# Altium footprint library Dart_Controller_Pcblib.PcbLib: 132 footprints (part 1 of 9)
Each footprint in its own frame and in the unit in brackets; x right, y up, seen from the top. Pads: shape width x height; smd on the part's side, far side on the other; paste and mask are expansions set on the pad; w line width, h text height; cw(c..) or ccw(c..) is an arc to the next point about the centre after c.
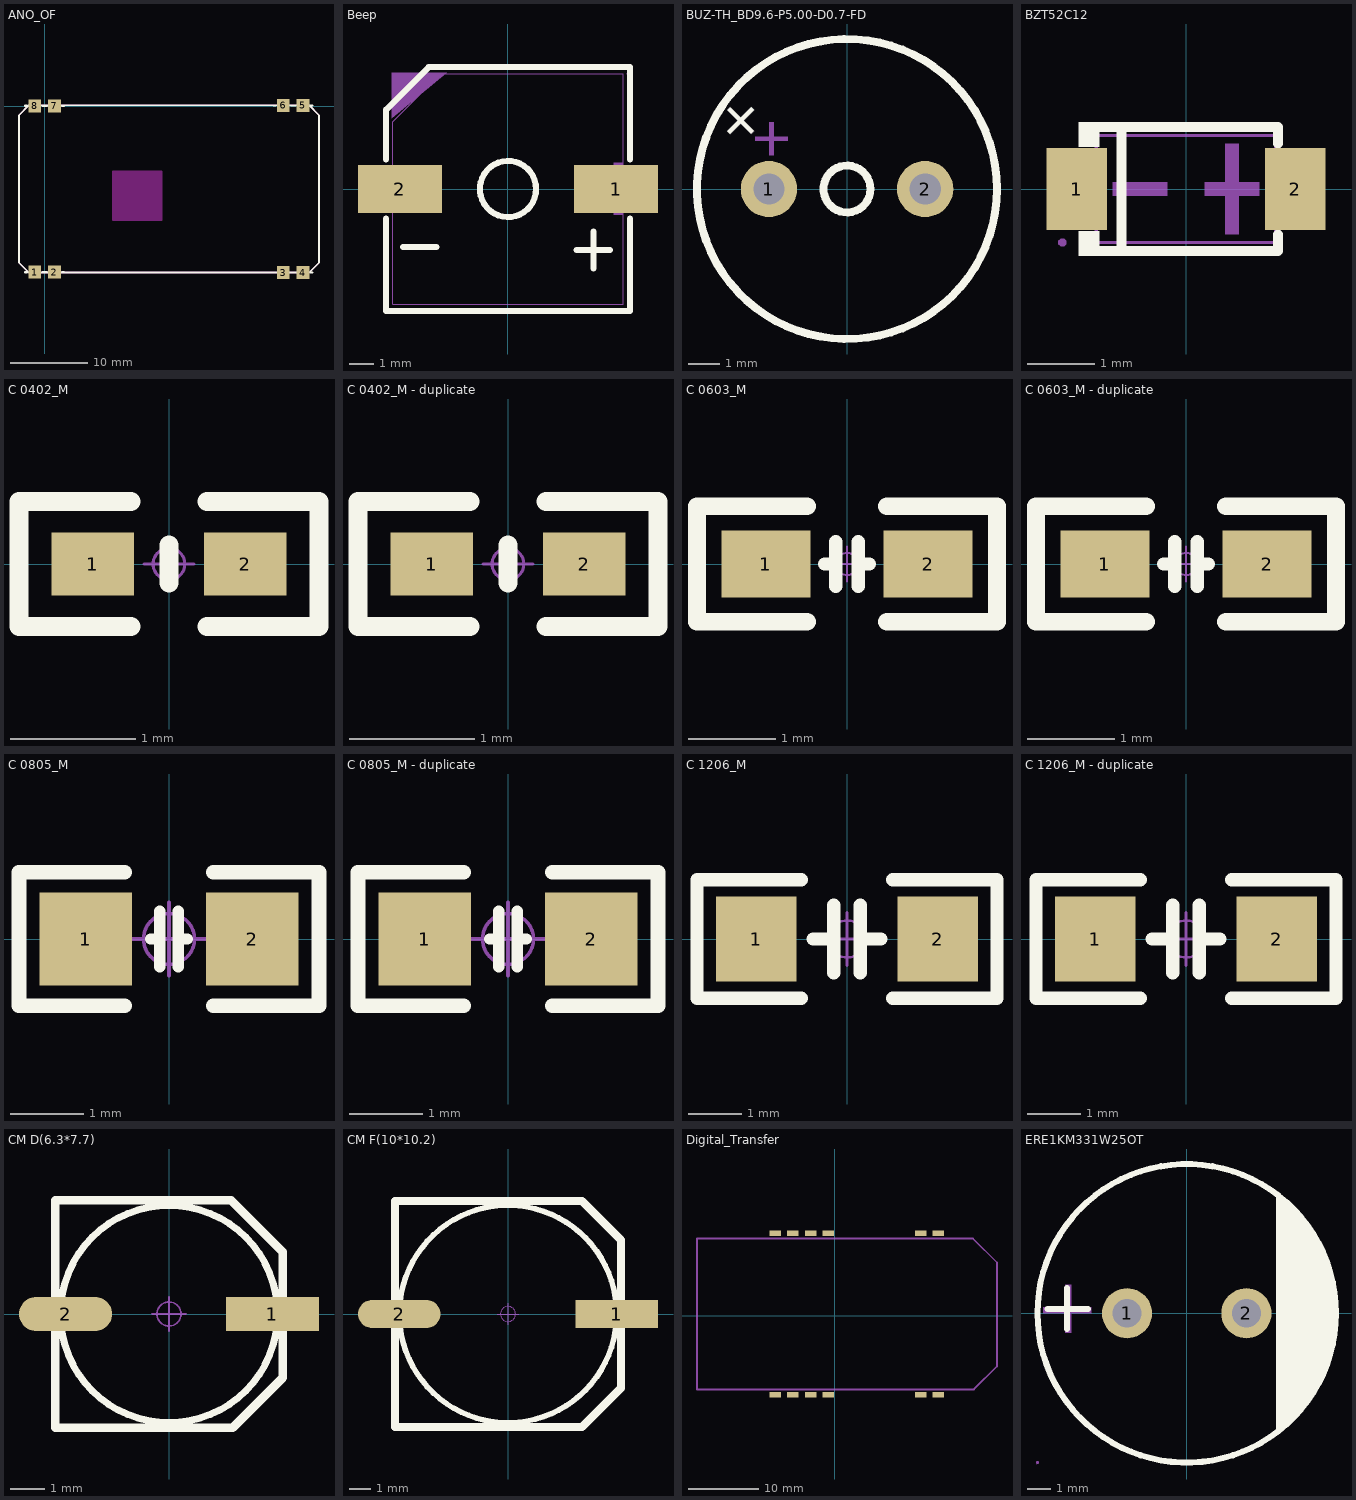
[diagram p0: the footprints below, top view; thin cyan lines are the x and y axes]

## ANO_OF [mil]
pads (8):
  rect 65x65 smd: 1(-50,-843) 2(50,-843) 3(1213,-845) 4(1313,-845) 5(1313,4) 6(1213,4) 7(50,2) 8(-50,2)
Top Overlay:
  lines w12: -98,-843 -89.5,-843 ; -98,2 -89,2 ; -10.5,-843 10.5,-843 ; -10.5,2 10.5,2 ; 89,-843 98,-843 ; 89.5,2 98,2 ; 1165,-845 1174,-845 ; 1165,4 1174,4 ; 1252.5,-845 1273.5,-845 ; 1252.5,4 1273.5,4 ; 1352.5,-845 1361,-845 ; 1352.5,4 1361,4
Top Overlay keep-out:
  lines w7.87: -130,-795 -80,-845 1345,-845 1395,-795 1395,-45 1345,5 -80,5 -130,-45 -130,-795
Keep-Out Layer:
  pour cut-out: 346,-580 596,-580 596,-330 346,-330
Keep-Out Layer:
  lines w8: 346,-580 346,-330 596,-330 596,-580 346,-580

## Beep [mm]
pads (2):
  rect 3.5x2 smd: 1(4.5,0) 2(-4.5,0)
Top Overlay:
  circle w0.254: c0.001,0 r1.171
  lines w0.254: -5.079,-1.232 -5.079,-5.08 5.081,-5.08 5.081,-1.231 ; -5.079,1.232 -5.079,3.302 -3.301,5.08 5.081,5.08 5.081,1.231 ; -4.381,-2.413 -2.984,-2.413 ; 2.858,-2.54 4.255,-2.54 ; 3.557,-3.302 3.557,-1.778
Mechanical 6:
  region: 3.493,0.191 5.652,0.191 5.652,-0.191 3.493,-0.191
  region: 4.41,-1.07 4.41,1.089 4.791,1.089 4.791,-1.07
  region: -5.508,0.191 -3.349,0.191 -3.349,-0.191 -5.508,-0.191
  region: -2.55,4.85 -4.85,4.85 -4.85,2.95
Mechanical 15:
  region: 5.06,4.8 5.059,4.824 5.024,4.858 4.976,4.858 4.941,4.824 4.94,4.8 4.941,4.776 4.976,4.742 5.024,4.742 5.059,4.776
  region: 3.3,0.75 5,0.75 5,-0.75 3.3,-0.75
  region: -3.3,-0.75 -5,-0.75 -5,0.75 -3.3,0.75
  lines w0.051: -4.8,-4.8 4.8,-4.8 4.8,4.8 -2.8,4.8 -4.8,2.8 -4.8,-4.8
3D body "Buzzer-PCBModelSOLID.step": height 4.95, standoff 0, extent -4.746,-4.81 5.254,4.8

## BUZ-TH_BD9.6-P5.00-D0.7-FD [mm]
pads (2):
  round 1.8 hole 1 paste-2539.97 mask+0.051: 1(-2.5,0) 2(2.5,0)
Top Overlay:
  circle w0.254: c0,0 r4.8
  circle w0.254: c0,0 r0.75
  text "+" at -2.481,2.059 h1.27
Mechanical 15:
  region: -2.484,1.084 -2.344,1.084 -2.344,2.134 -2.484,2.134 -2.484,2.114
  region: -2.939,1.679 -2.939,1.539 -1.889,1.539 -1.889,1.679 -1.909,1.679
3D body "Beeper_CORR.step": height 5.51, standoff -4.5, extent -4.5,-4.5 4.5,4.5

## BZT52C12 [mm] "稳压二级管"
pads (2):
  rect 0.91x1.22 smd: 1(-1.635,0) 2(1.635,0)
Top Overlay:
  region: -1.3,-1.002 -1.3,-0.632 -1.605,-0.632 -1.605,-1.002
  region: -1.3,1.002 -1.3,0.632 -1.605,0.632 -1.605,1.002
  lines w0.152: -1.376,-0.926 1.376,-0.926 1.376,-0.683 ; -1.376,0.926 1.376,0.926 1.376,0.683 ; -0.967,-0.926 -0.967,0.926
Mechanical 6:
  region: 0.79,0.68 0.79,-0.68 0.586,-0.68 0.586,0.68
  region: 1.096,0.102 1.096,-0.102 0.28,-0.102 0.28,0.102
  region: -1.096,0.102 -1.096,-0.102 -0.28,-0.102 -0.28,0.102
Mechanical 15:
  region: -1.81,-0.3 -1.33,-0.3 -1.33,0.3 -1.81,0.3
  region: 1.81,0.3 1.33,0.3 1.33,-0.3 1.81,-0.3
  region: 1.595,0.3 1.845,0.3 1.845,-0.3 1.595,-0.3
  region: -1.845,0.3 -1.595,0.3 -1.595,-0.3 -1.845,-0.3
  region: -1.79,-0.8 -1.791,-0.776 -1.826,-0.742 -1.874,-0.742 -1.909,-0.776 -1.91,-0.8 -1.909,-0.824 -1.874,-0.858 -1.826,-0.858 -1.791,-0.824
  lines w0.051: -1.345,-0.8 1.345,-0.8 1.345,0.8 -1.345,0.8 -1.345,-0.8
3D body "BZT52C12-PCBModelSOLID.step": height 0.57, standoff -0.73, extent -1.723,-0.8 1.977,0.8

## C 0402_M [mil] "无极性贴片电容                                  淘宝ID:黄晶宝石"
pads (2):
  rect 26x20 smd: 1(-24,0) 2(24,0)
Top Overlay:
  lines w6: -12,-19.68 -47.24,-19.68 -47.24,19.68 -12,19.68 ; 0,-6 0,6 ; 12,-19.68 47.24,-19.68 47.24,19.68 12,19.68
Mechanical 15:
  circle w1: c0,0 r5
  lines w1: -7.87,0 7.87,0 ; 0,-7.87 0,7.87
3D body "C 0402.STEP": height 20.68, standoff 0.21, extent -19.69,-10.24 19.69,10.24

## C 0402_M - duplicate [mil] "无极性贴片电容                                  淘宝ID:黄晶宝石"
pads (2):
  rect 26x20 smd: 1(-24,0) 2(24,0)
Top Overlay:
  lines w6: -12,-19.68 -47.24,-19.68 -47.24,19.68 -12,19.68 ; 0,-6 0,6 ; 12,-19.68 47.24,-19.68 47.24,19.68 12,19.68
Mechanical 15:
  circle w1: c0,0 r5
  lines w1: -7.87,0 7.87,0 ; 0,-7.87 0,7.87
3D body "C 0402.STEP": height 20.68, standoff 0.21, extent -19.69,-10.24 19.69,10.24

## C 0603_M [mil] "无极性贴片电容                                淘宝ID:黄晶宝石"
pads (2):
  rect 40x30 smd: 1(-36.5,0) 2(36.5,0)
Top Overlay:
  lines w6: -10,0 -5,0 ; -5,-10 -5,10 ; 5,-10 5,10 ; 5,0 10,0
  lines w8: -18,-26 -67.5,-26 -67.5,26 -18,26 ; 18,-26 67.5,-26 67.5,26 18,26
Mechanical 15:
  circle w1: c0,0 r5
  lines w1: -7.87,0 7.87,0 ; 0,-7.87 0,7.87
3D body "C 0603.STEP": height 31.89, standoff -0.39, extent -31.5,-16.14 31.5,16.14

## C 0603_M - duplicate [mil] "无极性贴片电容                                淘宝ID:黄晶宝石"
pads (2):
  rect 40x30 smd: 1(-36.5,0) 2(36.5,0)
Top Overlay:
  lines w6: -10,0 -5,0 ; -5,-10 -5,10 ; 5,-10 5,10 ; 5,0 10,0
  lines w8: -18,-26 -67.5,-26 -67.5,26 -18,26 ; 18,-26 67.5,-26 67.5,26 18,26
Mechanical 15:
  circle w1: c0,0 r5
  lines w1: -7.87,0 7.87,0 ; 0,-7.87 0,7.87
3D body "C 0603.STEP": height 31.89, standoff -0.39, extent -31.5,-16.14 31.5,16.14

## C 0805_M [mil] "无极性贴片电容                                         淘宝ID:黄晶宝石"
height 19.68
pads (2):
  rect 50x50 smd: 1(-45,0) 2(45,0)
Top Overlay:
  lines w6: -10,0 -5,0 ; -5,-15 -5,15 ; 5,-15 5,15 ; 5,0 10,0
  lines w8: -24,-36 -81,-36 -81,36 -24,36 ; 24,-36 81,-36 81,36 24,36
Mechanical 15:
  circle w1.97: c0,0 r13.78
  lines w1.97: -19.68,0 19.68,0 ; 0,-19.68 0,19.68
3D body "C 0805.STEP": height 20.08, standoff -0.39, extent -39.37,-24.02 39.37,24.02

## C 0805_M - duplicate [mil] "无极性贴片电容                                         淘宝ID:黄晶宝石"
height 19.68
pads (2):
  rect 50x50 smd: 1(-45,0) 2(45,0)
Top Overlay:
  lines w6: -10,0 -5,0 ; -5,-15 -5,15 ; 5,-15 5,15 ; 5,0 10,0
  lines w8: -24,-36 -81,-36 -81,36 -24,36 ; 24,-36 81,-36 81,36 24,36
Mechanical 15:
  circle w1.97: c0,0 r13.78
  lines w1.97: -19.68,0 19.68,0 ; 0,-19.68 0,19.68
3D body "C 0805.STEP": height 20.08, standoff -0.39, extent -39.37,-24.02 39.37,24.02

## C 1206_M [mil] "无极性贴片电容"
pads (2):
  rect 60x62.99 smd: 1(-67.5,0) 2(67.5,0)
Top Overlay:
  lines w10: -34,-44 -111.5,-44 -111.5,44 -34,44 ; -25,0 -10,0 ; -10,-25 -10,25 ; 10,-25 10,25 ; 10,0 25,0 ; 34,-44 111.5,-44 111.5,44 34,44
Mechanical 15:
  circle w1.97: c0,0 r13.78
  lines w1.97: -19.68,0 19.68,0 ; 0,-19.68 0,19.68
3D body "C 1206.STEP": height 47.64, standoff -0.39, extent -62.99,-31.89 62.99,31.89

## C 1206_M - duplicate [mil] "无极性贴片电容"
pads (2):
  rect 60x62.99 smd: 1(-67.5,0) 2(67.5,0)
Top Overlay:
  lines w10: -34,-44 -111.5,-44 -111.5,44 -34,44 ; -25,0 -10,0 ; -10,-25 -10,25 ; 10,-25 10,25 ; 10,0 25,0 ; 34,-44 111.5,-44 111.5,44 34,44
Mechanical 15:
  circle w1.97: c0,0 r13.78
  lines w1.97: -19.68,0 19.68,0 ; 0,-19.68 0,19.68
3D body "C 1206.STEP": height 47.64, standoff -0.39, extent -62.99,-31.89 62.99,31.89

## CM D(6.3*7.7) [mm] "贴片电解电容，直径6.3mm，高7.7mm         淘宝ID:黄晶宝石"
pads (2):
  rect 2.7x1 smd: 1(3,0)
  oval 2.7x1 smd: 2(-3,0)
Top Overlay:
  circle w0.2: c0,0 r3.15
  lines w0.254: -3.3,-3.3 -3.3,3.3 1.8,3.3 3.3,1.8 3.3,-1.85 1.85,-3.3 -3.3,-3.3
Mechanical 15:
  circle w0.05: c0,0 r0.35
  lines w0.05: -0.5,0 0.5,0 ; 0,-0.5 0,0.5
3D body "CM D(6.3X7.7).STEP": height 7.7, standoff -0.01, extent -3.5,-3.3 3.5,3.3

## CM F(10*10.2) [mm] "贴片电解电容，直径10mm，高10.2mm    淘宝ID:黄晶宝石"
pads (2):
  rect 3.8x1.3 smd: 1(5,0)
  oval 3.8x1.3 smd: 2(-5,0)
Top Overlay:
  circle w0.254: c0,0 r5
  lines w0.381: 5.191,-3.413 3.404,-5.2 -5.2,-5.2 -5.2,5.2 3.404,5.2 5.2,3.404 5.2,-3.404
Mechanical 15:
  circle w0.05: c0,0 r0.35
  lines w0.05: -0.5,0 0.5,0 ; 0,-0.5 0,0.5
3D body "CM F(10X10.2).STEP": height 10.2, standoff -0.01, extent -5.8,-5.15 5.8,5.15

## Digital_Transfer [mil]
pads (12):
  rect 65x31.5 smd: 0(485,-445) 0(485,465) 0(585,-445) 0(585,465) 1(-335,-445) 2(-235,-445) 3(-135,-445) 4(-35,-445) 5(-35,465) 6(-135,465) 7(-235,465) 8(-335,465)
Mechanical 1:
  lines w10: -775,-415 -775,435 780,435 915,300 915,-285 785,-415 -775,-415

## ERE1KM331W25OT [mm]
pads (2):
  round 2.1 hole 1.2 paste-2539.97 mask+0.05: 1(-2.5,0) 2(2.5,0)
Top Overlay:
  circle w0.254: c0,0 r6.25
  region: 3.75,5 3.75,-5 4.482,-4.268 4.692,-4.058 5.068,-3.6 5.397,-3.107 5.677,-2.584 5.904,-2.036 6.076,-1.468 6.192,-0.887 6.25,-0.297 6.25,0 6.25,0.297 6.192,0.887 6.076,1.468 5.904,2.036 5.677,2.584 5.397,3.107 5.068,3.6 4.692,4.058 4.482,4.268
  lines w0.254: -5.817,0.178 -4.14,0.178 ; -5.004,-0.66 -5.004,1.067
Mechanical 6:
  region: -5.092,-0.811 -5.092,1.189 -4.842,1.189 -4.842,-0.811
  region: -6,0.25 -4,0.25 -4,0 -6,0
Mechanical 15:
  region: 2.8,0 2.799,0.059 2.752,0.167 2.668,0.25 2.559,0.294 2.441,0.294 2.332,0.25 2.248,0.167 2.201,0.059 2.2,0 2.201,-0.059 2.248,-0.167 2.332,-0.25 2.441,-0.294 2.559,-0.294 2.668,-0.25 2.752,-0.167 2.799,-0.059
  region: -2.2,0 -2.201,0.059 -2.248,0.167 -2.332,0.25 -2.441,0.294 -2.559,0.294 -2.668,0.25 -2.752,0.167 -2.799,0.059 -2.8,0 -2.799,-0.059 -2.752,-0.167 -2.668,-0.25 -2.559,-0.294 -2.441,-0.294 -2.332,-0.25 -2.248,-0.167 -2.201,-0.059
  region: -6.19,-6.25 -6.19,-6.225 -6.225,-6.19 -6.275,-6.19 -6.31,-6.225 -6.31,-6.25 -6.31,-6.275 -6.275,-6.31 -6.225,-6.31 -6.19,-6.275
  lines w0.051: -6.25,0 ccw(c0,0) 6.25,0 ccw(c0,0) -6.25,0